# Altium footprint library Comp LIb.PcbLib: 34 footprints (part 1 of 3)
Each footprint in its own frame and in the unit in brackets; x right, y up, seen from the top. Pads: shape width x height; smd on the part's side, far side on the other; paste and mask are expansions set on the pad; w line width, h text height; cw(c..) or ccw(c..) is an arc to the next point about the centre after c.
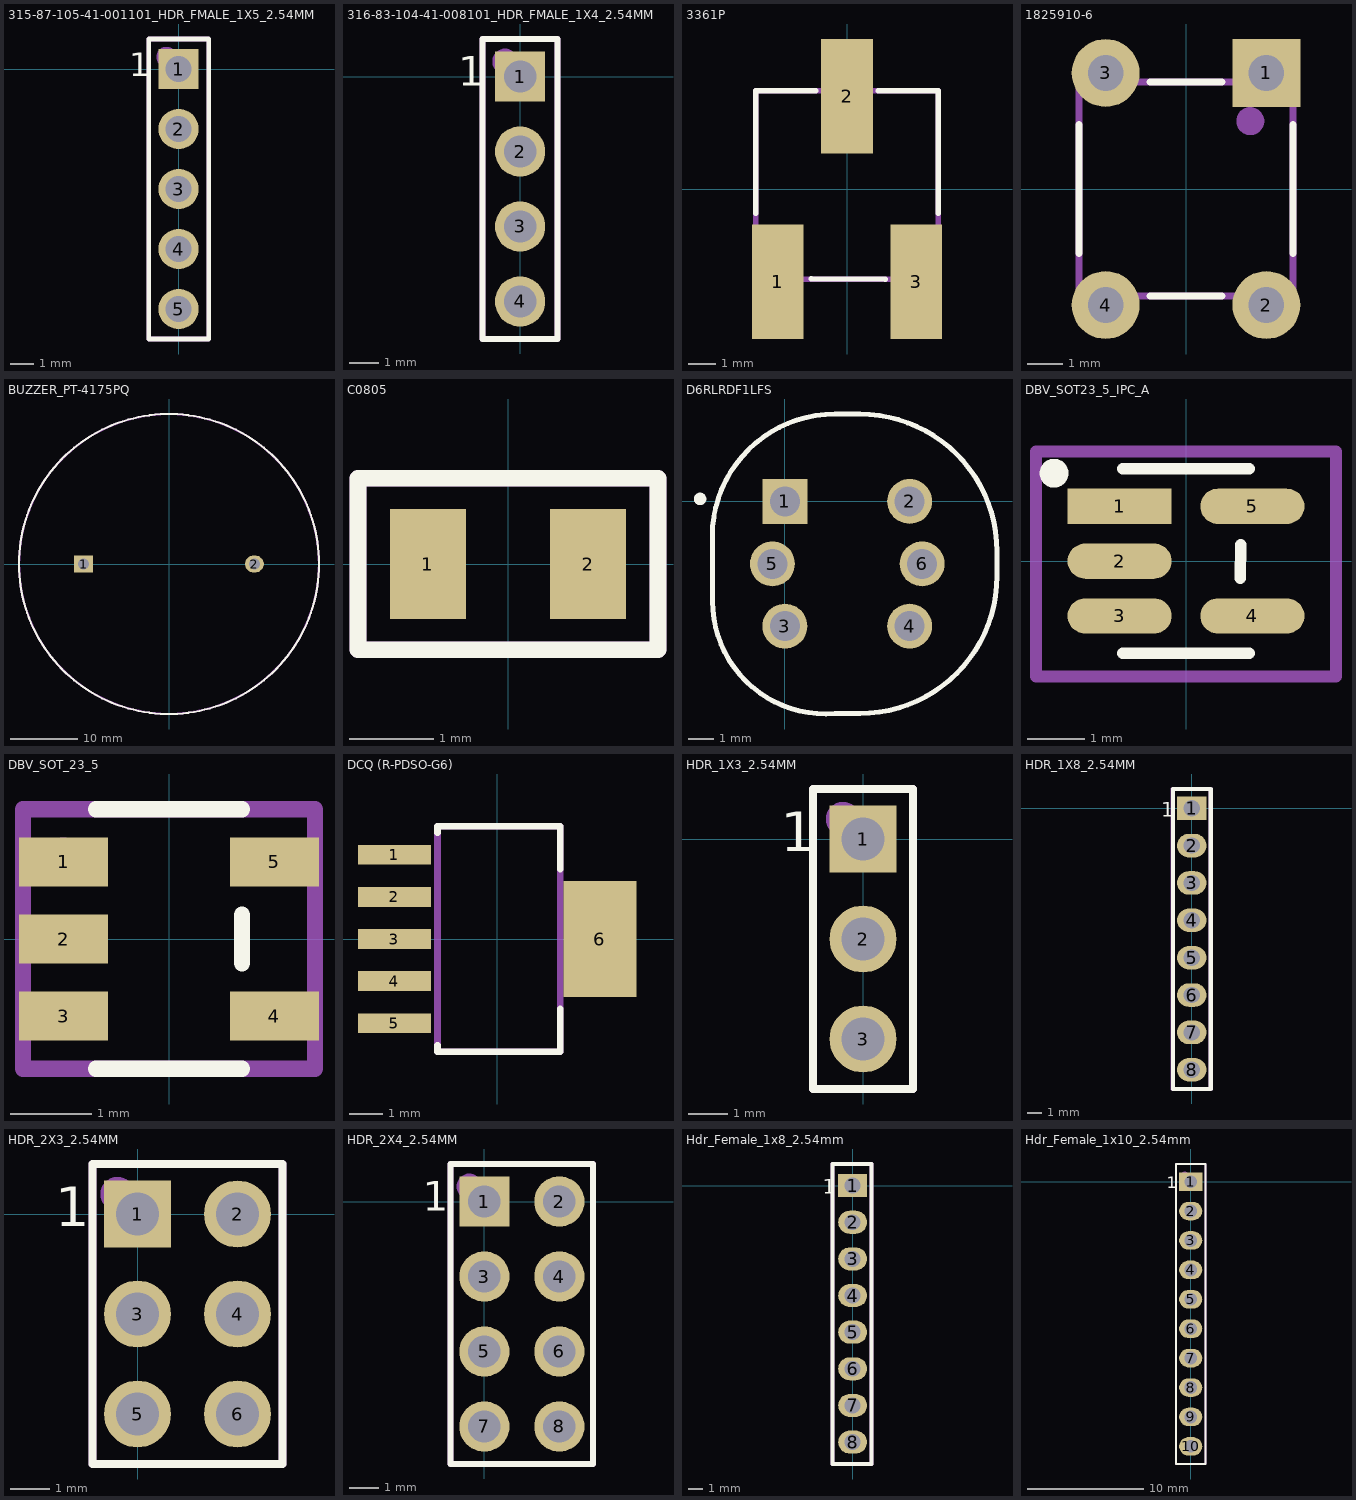
[diagram p0: the footprints below, top view; thin cyan lines are the x and y axes]

## 315-87-105-41-001101_HDR_FMALE_1X5_2.54MM [mm] "MPN: 315-87-105-41-001101"
pads (5):
  rect 1.7x1.7 hole 1.1: 1(0,0)
  round 1.7 hole 1.1: 2(0,-2.54) 3(0,-5.08) 4(0,-7.62) 5(0,-10.16)
Top Overlay:
  lines w0.2: -1.27,-11.43 -1.27,1.27 1.27,1.27 1.27,-11.43 -1.27,-11.43
  text "1" at -2.086,-0.308 h1
Mechanical 29:
  circle w0.508: c-0.508,0.508 r0.18
  lines w0.2: -1.27,-11.43 -1.27,1.27 1.27,1.27 1.27,-11.43 -1.27,-11.43
  text ".Designator" at 0.367,-8.6 h1
3D body "pcb_connector_315-87-105-41-001101.stp": height 2.96, standoff -2.89, extent -1.27,-11.43 1.27,1.27

## 316-83-104-41-008101_HDR_FMALE_1X4_2.54MM [mm]
pads (4):
  rect 1.7x1.7 hole 1.1: 1(0,0)
  round 1.7 hole 1.1: 2(0,-2.54) 3(0,-5.08) 4(0,-7.62)
Top Overlay:
  lines w0.2: -1.27,-8.89 1.27,-8.89 1.27,1.27 -1.27,1.27 -1.27,-8.89
  text "1" at -2.086,-0.308 h1
Mechanical 29:
  circle w0.508: c-0.508,0.508 r0.18
  lines w0.2: -1.27,-8.89 1.27,-8.89 1.27,1.27 -1.27,1.27 -1.27,-8.89
  text ".Designator" at 0.62,-5.946 h1.5
3D body "pcb_connector_316-83-104-41-008101.stp": height 4.1, standoff -11, extent -1.27,-8.89 1.27,1.27

## 3361P [mm]
pads (3):
  rect 1.9x4.2 smd paste+0: 1(-2.54,-3.4) 2(0,3.4) 3(2.54,-3.4)
Top Overlay:
  lines w0.2: -3.353,-0.889 -3.353,3.6 -1.143,3.6 ; -1.316,-3.295 1.397,-3.302 ; 1.143,3.6 3.353,3.6 3.353,-0.889
Mechanical 29:
  lines w0.2: -3.353,-3.302 3.353,-3.302 3.353,3.6 -3.353,3.6 -3.353,-3.302
  text ".Designator" at -3,-0.434 h2
3D body "Res_Bourns_3361P-1-502GLF_eec.STEP": height 5.84, standoff -0.02, extent -3.353,-4.229 3.353,4.305

## 1825910-6 [mm]
pads (4):
  rect 1.9x1.9 hole 1: 1(2.25,3.25)
  round 1.9 hole 1: 2(2.25,-3.25) 3(-2.25,3.25) 4(-2.25,-3.25)
Top Overlay:
  lines w0.2: -3,-1.8 -3,1.8 ; -1,-3 1,-3 ; -1,3 1,3 ; 3,-1.8 3,1.8
Mechanical 29:
  circle w0.5: c1.8,1.9 r0.141
  lines w0.2: -3,-3 3,-3 3,3 -3,3 -3,-3
  text ".Designator" at -2.1,-0.067 h1.6
3D body "User Library-FSM4JLH(1825910-5).step": height 5, standoff -3.51, extent -2.995,-3.9 2.995,3.9

## BUZZER_PT-4175PQ [mm]
pads (2):
  rect 2.8x2.5 hole 1.6: 1(-12.7,0)
  oval 2.8x2.5 hole 1.6: 2(12.7,0)
Top Overlay:
  circle w0.3: c0,0 r22.3
Mechanical 1:
  circle w0.3: c0,0 r22.273
  circle w0.3: c-12.7,0 r0.65
  circle w0.3: c12.7,0 r0.65
Mechanical 29:
  circle w0.3: c0,0 r22.3
3D body: height 14.2, standoff 0.1, extent -22.273,-22.273 22.273,22.273
3D body: height 0, standoff -5.7, extent -13.35,-0.65 -12.05,0.65
3D body: height 0, standoff -5.7, extent 12.05,-0.65 13.35,0.65

## C0805 [mm]
pads (2):
  rect 0.9x1.3 smd: 1(-0.95,0) 2(0.95,0)
Top Overlay:
  lines w0.2: -1.778,-1.016 -1.778,1.016 1.778,1.016 1.778,-1.016 -1.778,-1.016
Mechanical 29:
  lines w0.2: -1.778,-1.016 -1.778,1.016 1.778,1.016 1.778,-1.016 -1.778,-1.016
  text ".Designator" at -0.916,-0.208 h0.6
3D body "CAPC2012X95N EIA 0805.step": height 0.96, standoff 0.01, extent -1,-0.6 1,0.6
3D body "CAPC2012X95N EIA 0805.step": height 1.46, standoff 0.51, extent -1,-0.6 1,0.6

## D6RLRDF1LFS [mm]
pads (6):
  rect 1.8x1.8 hole 1.2: 1(0,0)
  round 1.8 hole 1.2: 2(5,0) 3(0,-5) 4(5,-5) 5(-0.5,-2.5) 6(5.5,-2.5)
Top Overlay:
  circle w0.25: c-3.4,0.1 r0.125
  lines w0.2: -2.9,-1 -2.9,-4 ccw(c1.616,-4) 2.002,-8.499 ; -2.9,-0.998 cw(c2,-1.418) 2,3.5 3,3.5 cw(c3,-2) 8.5,-2 8.5,-3 cw(c3,-3) 3,-8.5 2.5,-8.5 2,-8.5
Mechanical 29:
  lines w0.1: -2.9,-1 -2.9,-4 ccw(c1.616,-4) 2.002,-8.499 ; -2.9,-0.998 cw(c2,-1.418) 2,3.5 3,3.5 cw(c3,-2) 8.5,-2 8.5,-3 cw(c3,-3) 3,-8.5 2.5,-8.5 2,-8.5
  text ".Designator" at 0.75,-3.95 h1.5
3D body "D6RLRDF1_LFS.stp": height 14.23, standoff -3.57, extent -2.9,-8.501 8.5,3.481

## DBV_SOT23_5_IPC_A [mm] "i.e. for hand soldering"
pads (5):
  rect 1.805x0.612 smd paste+0: 1(-1.15,0.95)
  rrect100% 1.805x0.612 smd paste+0: 2(-1.15,0) 4(1.15,-0.95) 5(1.15,0.95)
  rrect100% 1.805x0.612 smd: 3(-1.15,-0.95)
Top Overlay:
  circle w0.25: c-2.286,1.524 r0.125
  lines w0.2: -1.1,-1.6 1.1,-1.6 ; -1.1,1.6 1.1,1.6 ; 0.944,-0.3 0.946,0.287
Mechanical 1:
  lines w0.2: -2.6,-2 -2.6,1.9 2.6,1.9 2.6,-2 -2.6,-2

## DBV_SOT_23_5 [mm]
pads (5):
  rect 1.1x0.6 smd: 1(-1.3,0.95) 2(-1.3,0) 3(-1.3,-0.95) 4(1.3,-0.95) 5(1.3,0.95)
Top Overlay:
  lines w0.2: -0.9,-1.6 0.9,-1.6 ; -0.9,1.6 0.9,1.6 ; 0.9,-0.3 0.9,0.3
Mechanical 29:
  circle w0.3: c-1.3,1 r0.1
  lines w0.2: -1.8,-1.6 1.8,-1.6 1.8,1.6 -1.8,1.6 -1.8,-1.6
  text ".Designator" at -1,-0.2 h0.6
3D body "User Library-TPS560200DBV.step": height 1.45, standoff 0, extent -1.514,-1.5 1.514,1.5

## DCQ (R-PDSO-G6) [mm]
pads (6):
  rect 2.2x0.6 smd: 1(-3.1,2.54) 2(-3.1,1.27) 3(-3.1,0) 4(-3.1,-1.27) 5(-3.1,-2.54)
  rect 2.2x3.5 smd: 6(3.1,0)
Top Overlay:
  lines w0.2: -1.8,-3.2 -1.8,-3.4 1.9,-3.4 1.9,-2.1 ; -1.8,3.2 -1.8,3.4 1.9,3.4 1.9,2.1
Mechanical 29:
  lines w0.2: -1.8,-3.4 -1.8,3.4 1.9,3.4 1.9,-3.4 -1.8,-3.4
  text ".Designator" at -1.1,-0.5 h1.5
3D body "User Library-TPS73701DCQ.step": height 1.79, standoff -0.01, extent -3.63,-3.275 3.63,3.275

## HDR_1X3_2.54MM [mm]
pads (3):
  rect 1.7x1.7 hole 1.1: 1(0,0)
  round 1.7 hole 1.1: 2(0,-2.54) 3(0,-5.08)
Top Overlay:
  lines w0.2: -1.27,-6.35 1.27,-6.35 1.27,1.27 -1.27,1.27 -1.27,-6.35
  text "1" at -2.086,-0.308 h1
Mechanical 29:
  circle w0.508: c-0.508,0.508 r0.18
  lines w0.2: -1.27,-6.35 -1.27,1.27 1.27,1.27 1.27,-6.35 -1.27,-6.35
  text ".Designator" at 0.762,-3.556 h1.52
3D body "68705-103HLF.STEP": height 7.63, standoff -2.4, extent -1.205,-6.35 1.205,1.27

## HDR_1X8_2.54MM [mm]
pads (8):
  rect 2x1.6 hole 1.1: 1(0,0)
  oval 2x1.6 hole 1.1: 2(0,-2.54) 3(0,-5.08) 4(0,-7.62) 5(0,-10.16) 6(0,-12.7) 7(0,-15.24) 8(0,-17.78)
Top Overlay:
  lines w0.3: -1.275,-19.09 1.3,-19.09 1.3,1.31 -1.275,1.31 -1.275,-19.09
  text "1" at -2.086,-0.562 h1
Mechanical 29:
  circle w0.6: c0,0 r0.254
  lines w0.3: -1.3,-19.09 1.3,-19.09 1.3,1.31 -1.3,1.31 -1.3,-19.09
  text ".Designator" at 0.45,-14.74 h1.5
3D body "77311-101-08LF.stp": height 8.39, standoff -2.41, extent -1.2,-18.85 1.21,1.07

## HDR_2X3_2.54MM [mm]
pads (6):
  rect 1.7x1.7 hole 1.1: 1(0,0)
  round 1.7 hole 1.1: 2(2.54,0) 3(0,-2.54) 4(2.54,-2.54) 5(0,-5.08) 6(2.54,-5.08)
Top Overlay:
  lines w0.2: -1.143,-6.35 3.683,-6.35 3.683,1.27 -1.143,1.27 -1.143,-6.35
  text "1" at -2.086,-0.308 h1
Mechanical 29:
  circle w0.508: c-0.508,0.508 r0.18
  lines w0.2: -1.143,-6.35 -1.143,1.27 3.683,1.27 3.683,-6.35 -1.143,-6.35
  text ".Designator" at 1.651,-4.064 h1.52
3D body "10129381-906001BLF--3DModel-STEP-533217.STEP": height 5.6, standoff -5.83, extent -1.143,-6.35 3.691,1.27

## HDR_2X4_2.54MM [mm]
pads (8):
  rect 1.7x1.7 hole 1.1: 1(0,0)
  round 1.7 hole 1.1: 2(2.54,0) 3(0,-2.54) 4(2.54,-2.54) 5(0,-5.08) 6(2.54,-5.08) 7(0,-7.62) 8(2.54,-7.62)
Top Overlay:
  lines w0.2: -1.143,-8.89 3.683,-8.89 3.683,1.27 -1.143,1.27 -1.143,-8.89
  text "1" at -2.086,-0.308 h1
Mechanical 29:
  circle w0.508: c-0.508,0.508 r0.18
  lines w0.2: -1.143,-8.89 3.683,-8.89 3.683,1.27 -1.143,1.27 -1.143,-8.89
  text ".Designator" at 1.905,-7.747 h1.52
3D body "10129381-908001BLF.step": height 5.6, standoff -5.83, extent -1.143,-8.89 3.691,1.27

## Hdr_Female_1x8_2.54mm [mm]
pads (8):
  rect 2x1.6 hole 1.1: 1(0,0)
  oval 2x1.6 hole 1.1: 2(0,-2.54) 3(0,-5.08) 4(0,-7.62) 5(0,-10.16) 6(0,-12.7) 7(0,-15.24) 8(0,-17.78)
Top Overlay:
  lines w0.3: -1.3,-19.3 1.3,-19.3 1.3,1.5 -1.4,1.5 -1.4,-19.3 -0.5,-19.3
  text "1" at -2.086,-0.562 h1
Mechanical 29:
  circle w0.6: c0,0 r0.254
  lines w0.3: -1.4,-19.3 -1.4,1.5 1.3,1.5 1.3,-19.3 -1.4,-19.3
  text ".Designator" at 0.624,-16.972 h1.8
3D body "m20-7820842.stp": height 8.51, standoff -2.99, extent -1.3,-19.26 1.2,1.46

## Hdr_Female_1x10_2.54mm [mm]
pads (10):
  rect 2x1.6 hole 1.1: 1(0,0)
  oval 2x1.6 hole 1.1: 2(0,-2.54) 3(0,-5.08) 4(0,-7.62) 5(0,-10.16) 6(0,-12.7) 7(0,-15.24) 8(0,-17.78) 9(0,-20.32) 10(0,-22.86)
Top Overlay:
  lines w0.2: -1.27,-24.384 -1.27,1.524 ; -1.27,-24.384 1.27,-24.384 ; -1.27,-24.384 -1.27,1.524 ; -1.27,-24.384 1.27,-24.384 ; -1.27,1.524 1.27,1.524 ; -1.27,1.524 1.27,1.524 ; 1.27,-24.384 1.27,1.524 ; 1.27,-24.384 1.27,1.524
  text "1" at -2.086,-0.562 h1
Mechanical 29:
  circle w0.5: c-0.508,0.508 r0.1
  lines w0.2: -1.27,-24.384 -1.27,1.524 ; -1.27,-24.384 1.27,-24.384 ; -1.27,-24.384 -1.27,1.524 ; -1.27,-24.384 1.27,-24.384 ; -1.27,1.524 1.27,1.524 ; -1.27,1.524 1.27,1.524 ; 1.27,-24.384 1.27,1.524 ; 1.27,-24.384 1.27,1.524
  text ".Designator" at 0.878,-16.972 h1.8
3D body "m20-7821046.stp": height 8.52, standoff -2.98, extent -1.25,-24.276 1.25,1.524